# Altium footprint library WE-VD.PcbLib: 60 footprints (part 4 of 4)
Each footprint in its own frame and in the unit in brackets; x right, y up, seen from the top. Pads: shape width x height; smd on the part's side, far side on the other; paste and mask are expansions set on the pad; w line width, h text height; cw(c..) or ccw(c..) is an arc to the next point about the centre after c.
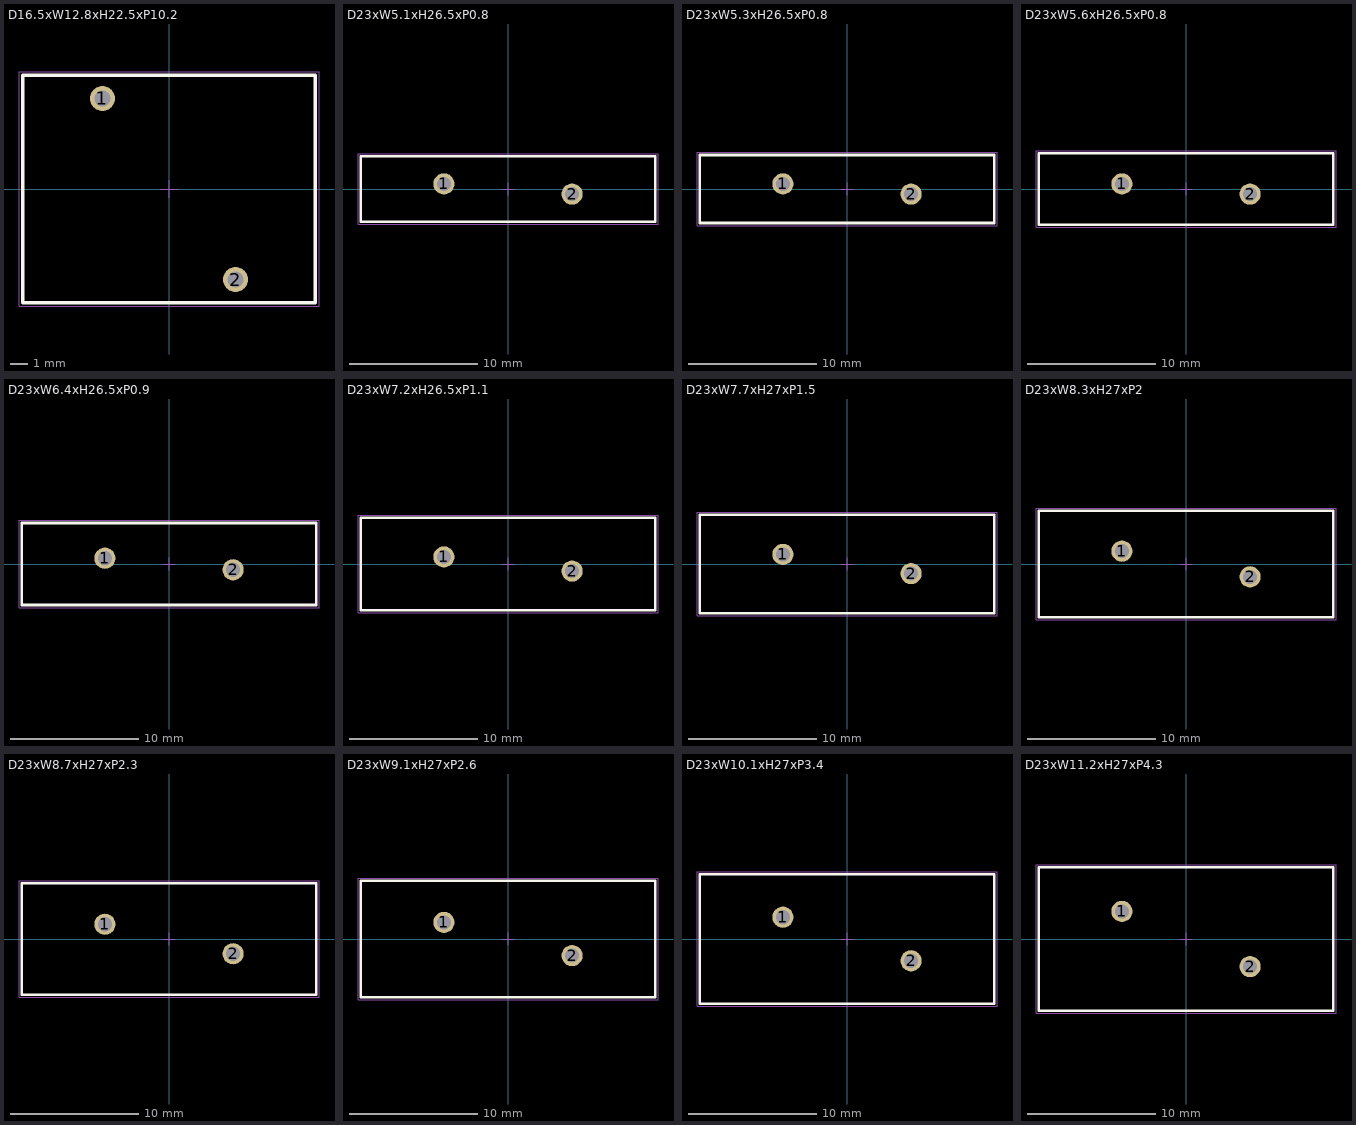
[diagram p3: the footprints below, top view; thin cyan lines are the x and y axes]

## D16.5xW12.8xH22.5xP10.2 [mm] "Disk Varistor, Diameter 16.5mm, Width 12.8mm"
height 22.5
pads (2):
  round 1.4 hole 0.9: 1(-3.75,5.1) 2(3.75,-5.1)
Top Overlay:
  lines w0.2: -8.25,-6.4 8.25,-6.4 8.25,6.4 -8.25,6.4 -8.25,-6.4
Top Designator:
  text ".Designator" at -7.498,-0.5 h1.5
Top Component Outline:
  lines w0.1: -8.25,-6.4 -8.25,6.4 8.25,6.4 8.25,-6.4 -8.25,-6.4
Top Courtyard:
  lines w0.05: -0.5,0 0.5,0 ; 0,-0.5 0,0.5 ; -8.45,-6.6 8.45,-6.6 8.45,6.6 -8.45,6.6 -8.45,-6.6
3D body "820x41021.stp": height 17.7, standoff -22.3, extent -7.5,-6 7.5,6

## D23xW5.1xH26.5xP0.8 [mm] "Disk Varistor, Diameter 23mm, Width 5.1mm"
height 26.5
pads (2):
  round 1.65 hole 1.1: 1(-5,0.4) 2(5,-0.4)
Top Overlay:
  lines w0.2: -11.5,-2.55 -11.5,2.55 11.5,2.55 11.5,-2.55 -11.5,-2.55
Top Designator:
  text ".Designator" at -7.498,-0.5 h1.5
Top Component Outline:
  lines w0.1: -11.5,-2.55 11.5,-2.55 11.5,2.55 -11.5,2.55 -11.5,-2.55
Top Courtyard:
  lines w0.05: -0.5,0 0.5,0 ; 0,-0.5 0,0.5 ; -11.7,-2.75 -11.7,2.75 11.7,2.75 11.7,-2.75 -11.7,-2.75
3D body "820x27501.stp": height 24, standoff -22.4, extent -10.694,-1.95 10.694,1.95

## D23xW5.3xH26.5xP0.8 [mm] "Disk Varistor, Diameter 23mm, Width 5.3mm"
height 26.5
pads (2):
  round 1.65 hole 1.1: 1(-5,0.4) 2(5,-0.4)
Top Overlay:
  lines w0.2: -11.5,-2.65 11.5,-2.65 11.5,2.65 -11.5,2.65 -11.5,-2.65
Top Designator:
  text ".Designator" at -7.498,-0.5 h1.5
Top Component Outline:
  lines w0.1: -11.5,-2.65 -11.5,2.65 11.5,2.65 11.5,-2.65 -11.5,-2.65
Top Courtyard:
  lines w0.05: -0.5,0 0.5,0 ; 0,-0.5 0,0.5 ; -11.7,-2.85 11.7,-2.85 11.7,2.85 -11.7,2.85 -11.7,-2.85
3D body "820x21311.stp": height 24, standoff -22.4, extent -10.694,-1.95 10.694,1.95

## D23xW5.6xH26.5xP0.8 [mm] "Disk Varistor, Diameter 23mm, Width 5.6mm"
height 26.5
pads (2):
  round 1.65 hole 1.1: 1(-5,0.4) 2(5,-0.4)
Top Overlay:
  lines w0.2: -11.5,-2.8 -11.5,2.8 11.5,2.8 11.5,-2.8 -11.5,-2.8
Top Designator:
  text ".Designator" at -7.498,-0.5 h1.5
Top Component Outline:
  lines w0.1: -11.5,-2.8 11.5,-2.8 11.5,2.8 -11.5,2.8 -11.5,-2.8
Top Courtyard:
  lines w0.05: -0.5,0 0.5,0 ; 0,-0.5 0,0.5 ; -11.7,-3 -11.7,3 11.7,3 11.7,-3 -11.7,-3
3D body "820x23006.stp": height 24, standoff -22.4, extent -10.7,-2.15 10.7,2.15

## D23xW6.4xH26.5xP0.9 [mm] "Disk Varistor, Diameter 23mm, Width 6.4mm"
height 26.5
pads (2):
  round 1.65 hole 1.1: 1(-5,0.45) 2(5,-0.45)
Top Overlay:
  lines w0.2: -11.5,-3.2 11.5,-3.2 11.5,3.2 -11.5,3.2 -11.5,-3.2
Top Designator:
  text ".Designator" at -7.498,-0.5 h1.5
Top Component Outline:
  lines w0.1: -11.5,-3.2 -11.5,3.2 11.5,3.2 11.5,-3.2 -11.5,-3.2
Top Courtyard:
  lines w0.05: -0.5,0 0.5,0 ; 0,-0.5 0,0.5 ; -11.7,-3.4 11.7,-3.4 11.7,3.4 -11.7,3.4 -11.7,-3.4
3D body "820x22511.stp": height 24, standoff -22.4, extent -10.694,-2.4 10.694,2.4

## D23xW7.2xH26.5xP1.1 [mm] "Disk Varistor, Diameter 23mm, Width 7.2mm"
height 26.5
pads (2):
  round 1.65 hole 1.1: 1(-5,0.55) 2(5,-0.55)
Top Overlay:
  lines w0.2: -11.5,-3.6 -11.5,3.6 11.5,3.6 11.5,-3.6 -11.5,-3.6
Top Designator:
  text ".Designator" at -7.498,-0.5 h1.5
Top Component Outline:
  lines w0.1: -11.5,-3.6 11.5,-3.6 11.5,3.6 -11.5,3.6 -11.5,-3.6
Top Courtyard:
  lines w0.05: -0.5,0 0.5,0 ; 0,-0.5 0,0.5 ; -11.7,-3.8 -11.7,3.8 11.7,3.8 11.7,-3.8 -11.7,-3.8
3D body "820x22711.stp": height 24, standoff -22.4, extent -10.694,-2.5 10.694,2.5

## D23xW7.7xH27xP1.5 [mm] "Disk Varistor, Diameter 23mm, Width 7.7mm"
height 27
pads (2):
  round 1.65 hole 1.1: 1(-5,0.75) 2(5,-0.75)
Top Overlay:
  lines w0.2: -11.5,-3.85 -11.5,3.85 11.5,3.85 11.5,-3.85 -11.5,-3.85
Top Designator:
  text ".Designator" at -7.498,-0.5 h1.5
Top Component Outline:
  lines w0.1: -11.5,-3.85 11.5,-3.85 11.5,3.85 -11.5,3.85 -11.5,-3.85
Top Courtyard:
  lines w0.05: -0.5,0 0.5,0 ; 0,-0.5 0,0.5 ; -11.7,-4.05 -11.7,4.05 11.7,4.05 11.7,-4.05 -11.7,-4.05
3D body "820x23211.stp": height 24, standoff -22.4, extent -10.694,-2.6 10.694,2.6

## D23xW8.3xH27xP2 [mm] "Disk Varistor, Diameter 23mm, Width 8.3mm"
height 27
pads (2):
  round 1.65 hole 1.1: 1(-5,1) 2(5,-1)
Top Overlay:
  lines w0.2: -11.5,-4.15 11.5,-4.15 11.5,4.15 -11.5,4.15 -11.5,-4.15
Top Designator:
  text ".Designator" at -7.498,-0.5 h1.5
Top Component Outline:
  lines w0.1: -11.5,-4.15 -11.5,4.15 11.5,4.15 11.5,-4.15 -11.5,-4.15
Top Courtyard:
  lines w0.05: -0.5,0 0.5,0 ; 0,-0.5 0,0.5 ; -11.7,-4.35 11.7,-4.35 11.7,4.35 -11.7,4.35 -11.7,-4.35
3D body "820x23811x.stp": height 24, standoff -22.4, extent -10.694,-2.95 10.694,2.95

## D23xW8.7xH27xP2.3 [mm] "Disk Varistor, Diameter 23mm, Width 8.7mm"
height 27
pads (2):
  round 1.65 hole 1.1: 1(-5,1.15) 2(5,-1.15)
Top Overlay:
  lines w0.2: -11.5,-4.35 11.5,-4.35 11.5,4.35 -11.5,4.35 -11.5,-4.35
Top Designator:
  text ".Designator" at -7.498,-0.5 h1.5
Top Component Outline:
  lines w0.1: -11.5,-4.35 -11.5,4.35 11.5,4.35 11.5,-4.35 -11.5,-4.35
Top Courtyard:
  lines w0.05: -0.5,0 0.5,0 ; 0,-0.5 0,0.5 ; -11.7,-4.55 11.7,-4.55 11.7,4.55 -11.7,4.55 -11.7,-4.55
3D body "820x24211x.stp": height 24, standoff -22.4, extent -10.694,-3.1 10.694,3.1

## D23xW9.1xH27xP2.6 [mm] "Disk Varistor, Diameter 23mm, Width 9.1mm"
height 27
pads (2):
  round 1.65 hole 1.1: 1(-5,1.3) 2(5,-1.3)
Top Overlay:
  lines w0.2: -11.5,-4.55 -11.5,4.55 11.5,4.55 11.5,-4.55 -11.5,-4.55
Top Designator:
  text ".Designator" at -7.498,-0.5 h1.5
Top Component Outline:
  lines w0.1: -11.5,-4.55 11.5,-4.55 11.5,4.55 -11.5,4.55 -11.5,-4.55
Top Courtyard:
  lines w0.05: -0.5,0 0.5,0 ; 0,-0.5 0,0.5 ; -11.7,-4.75 -11.7,4.75 11.7,4.75 11.7,-4.75 -11.7,-4.75
3D body "820x24611.stp": height 24, standoff -22.4, extent -10.694,-3.25 10.694,3.25

## D23xW10.1xH27xP3.4 [mm] "Disk Varistor, Diameter 23mm, Width 10.1mm"
height 27
pads (2):
  round 1.65 hole 1.1: 1(-5,1.7) 2(5,-1.7)
Top Overlay:
  lines w0.2: -11.5,-5.05 11.5,-5.05 11.5,5.05 -11.5,5.05 -11.5,-5.05
Top Designator:
  text ".Designator" at -7.498,-0.5 h1.5
Top Component Outline:
  lines w0.1: -11.5,-5.05 -11.5,5.05 11.5,5.05 11.5,-5.05 -11.5,-5.05
Top Courtyard:
  lines w0.05: -0.5,0 0.5,0 ; 0,-0.5 0,0.5 ; -11.7,-5.25 11.7,-5.25 11.7,5.25 -11.7,5.25 -11.7,-5.25
3D body "820x25511.stp": height 24, standoff -22.4, extent -10.694,-3.65 10.694,3.65

## D23xW11.2xH27xP4.3 [mm] "Disk Varistor, Diameter 23mm, Width 11.2mm"
height 27
pads (2):
  round 1.65 hole 1.1: 1(-5,2.15) 2(5,-2.15)
Top Overlay:
  lines w0.2: -11.5,-5.6 11.5,-5.6 11.5,5.6 -11.5,5.6 -11.5,-5.6
Top Designator:
  text ".Designator" at -7.498,-0.5 h1.5
Top Component Outline:
  lines w0.1: -11.5,-5.6 -11.5,5.6 11.5,5.6 11.5,-5.6 -11.5,-5.6
Top Courtyard:
  lines w0.05: -0.5,0 0.5,0 ; 0,-0.5 0,0.5 ; -11.7,-5.8 11.7,-5.8 11.7,5.8 -11.7,5.8 -11.7,-5.8
3D body "820x26811.stp": height 24, standoff -22.4, extent -10.694,-4.1 10.694,4.1